# Altium footprint library B105connectors.PcbLib: 71 footprints (part 1 of 5)
Each footprint in its own frame and in the unit in brackets; x right, y up, seen from the top. Pads: shape width x height; smd on the part's side, far side on the other; paste and mask are expansions set on the pad; w line width, h text height; cw(c..) or ccw(c..) is an arc to the next point about the centre after c.
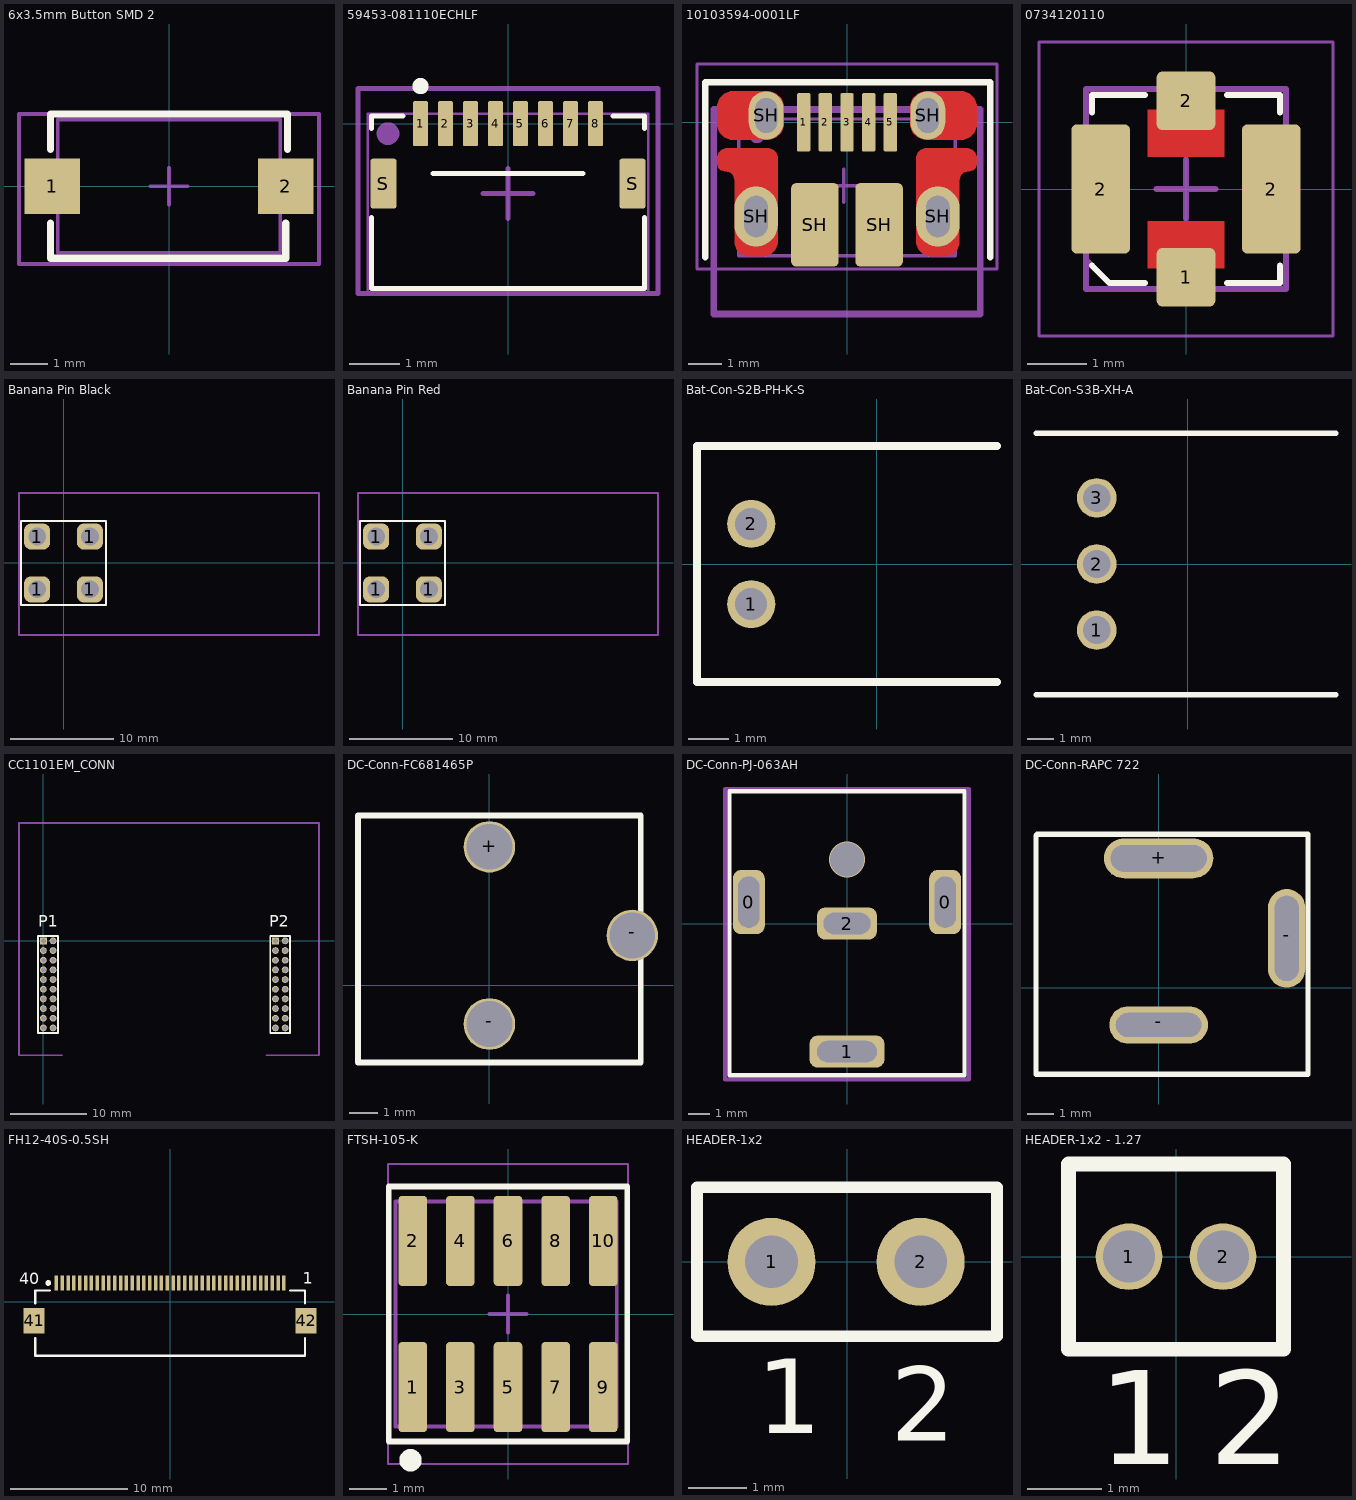
[diagram p0: the footprints below, top view; thin cyan lines are the x and y axes]

## 6x3.5mm Button SMD 2 [mm]
height 2.5
pads (2):
  rect 1.5x1.5 smd: 1(-3.15,0) 2(3.15,0)
Top Overlay:
  lines w0.2: -3.2,-1 -3.2,-1.95 3.15,-1.95 3.15,-1 ; -3.2,1 -3.2,1.95 3.2,1.95 3.2,1
Mechanical 13:
  lines w0.1: -3,-1.8 3,-1.8 3,1.8 -3,1.8 -3,-1.8
Mechanical 15:
  lines w0.1: -0.5,0 0.5,0 ; 0,-0.5 0,0.5 ; -4.05,-2.1 4.05,-2.1 4.05,1.95 -4.05,1.95 -4.05,-2.1
3D body "Button 6mm.step": height 2.5, standoff 0, extent -3.05,-1.85 3.05,1.85

## 59453-081110ECHLF [mm]
pads (10):
  rrect20% 0.3x0.9 smd: 1(-1.75,0) 2(-1.25,0) 3(-0.75,0) 4(-0.25,0) 5(0.25,0) 6(0.75,0) 7(1.25,0) 8(1.75,0)
  rrect20% 0.52x1 smd: S(-2.49,-1.2) S(2.49,-1.2)
Top Overlay:
  circle w0.254: c-1.75,0.75 r0.035
  lines w0.1: -2.725,-1.875 -2.725,-3.3 2.7,-3.3 2.725,-3.3 2.725,-1.875 ; -2.725,-0.1 -2.725,0.15 -2.1,0.15 ; -1.5,-1 1.5,-1 ; 2.1,0.15 2.725,0.15 2.725,-0.1
Mechanical 5:
  circle w0.254: c-2.4,-0.2 r0.1
  lines w0.05: -2.8,-3.4 -2.8,0.2 2.8,0.2 2.8,-3.4 -2.8,-3.4
  text ".Designator" at 1.95,-0.9 h1.5
Mechanical 15:
  lines w0.1: -0.5,-1.4 0.5,-1.4 ; 0,-1.9 0,-0.9 ; -3,-3.4 -3,0.7 3,0.7 3,-3.4 -3,-3.4
3D body "59453-081110echlf.stp": height 0.9, standoff 0, extent -2.75,-3.4 2.75,0.2

## 10103594-0001LF [mm]
pads (11):
  rrect20% 0.4x1.75 smd: 1(-1.3,0) 2(-0.65,0) 3(0,0) 4(0.65,0) 5(1.3,0)
  oval 1.3x1.8 hole 0.7 slot 1.25 at 90 deg: SH(-2.725,-2.825) SH(2.725,-2.825)
  oval 1.05x1.45 hole 0.65 slot 1.05 at 90 deg: SH(-2.425,0.205) SH(2.425,0.205)
  rrect20% 1.425x2.5 smd: SH(-0.962,-3.075) SH(0.962,-3.075)
Top Layer:
  region: -1.9,-0.025 -1.9,0.435 -1.9,0.534 -1.976,0.718 -2.117,0.859 -2.301,0.935 -2.4,0.935 -3.4,0.935 -3.499,0.935 -3.683,0.859 -3.824,0.718 -3.9,0.534 -3.9,0.435 -3.9,-0.025 -3.9,-0.124 -3.824,-0.308 -3.683,-0.449 -3.499,-0.525 -3.4,-0.525 -2.4,-0.525 -2.301,-0.525 -2.117,-0.449 -1.976,-0.308 -1.9,-0.124
  region: -2.075,-3.55 -2.075,-3.644 -2.147,-3.819 -2.281,-3.953 -2.456,-4.025 -2.55,-4.025 -2.9,-4.025 -2.994,-4.025 -3.169,-3.953 -3.303,-3.819 -3.375,-3.644 -3.375,-3.55 -3.375,-1.738 -3.38,-1.686 -3.419,-1.592 -3.492,-1.519 -3.586,-1.48 -3.638,-1.475 -3.69,-1.475 -3.786,-1.435 -3.86,-1.361 -3.9,-1.265 -3.9,-1.213 -3.9,-1.1 -3.9,-1.035 -3.851,-0.916 -3.759,-0.824 -3.64,-0.775 -3.575,-0.775 -2.4,-0.775 -2.335,-0.775 -2.216,-0.824 -2.124,-0.916 -2.075,-1.035 -2.075,-1.1
  region: 2.075,-3.55 2.075,-3.644 2.147,-3.819 2.281,-3.953 2.456,-4.025 2.55,-4.025 2.9,-4.025 2.994,-4.025 3.169,-3.953 3.303,-3.819 3.375,-3.644 3.375,-3.55 3.375,-1.738 3.38,-1.686 3.419,-1.592 3.492,-1.519 3.586,-1.48 3.638,-1.475 3.69,-1.475 3.786,-1.435 3.86,-1.361 3.9,-1.265 3.9,-1.213 3.9,-1.1 3.9,-1.035 3.851,-0.916 3.759,-0.824 3.64,-0.775 3.575,-0.775 2.4,-0.775 2.335,-0.775 2.216,-0.824 2.124,-0.916 2.075,-1.035 2.075,-1.1
  region: 1.9,-0.025 1.9,0.435 1.9,0.534 1.976,0.718 2.117,0.859 2.301,0.935 2.4,0.935 3.4,0.935 3.499,0.935 3.683,0.859 3.824,0.718 3.9,0.534 3.9,0.435 3.9,-0.025 3.9,-0.124 3.824,-0.308 3.683,-0.449 3.499,-0.525 3.4,-0.525 2.4,-0.525 2.301,-0.525 2.117,-0.449 1.976,-0.308 1.9,-0.124
Top Overlay:
  lines w0.2: -4.25,-4.05 -4.25,1.2 4.25,1.2 ; 4.3,-4.05 4.3,1.2
Top Paste:
  rectangle: -4,-4.25 -2,-0.8
  rectangle: -4,-0.5 -1.9,1.25
  region: 4,1.25 1.9,1.25 1.9,-0.5 4,-0.5
  region: 4,-0.8 2,-0.8 2,-4.25 4,-4.25
Mechanical 5:
  circle w0.254: c-2.7,-0.4 r0.1
  lines w0.1: -3.25,-4 -3.25,0.1 3.25,0.1 3.25,-4 -3.25,-4
  text ".Designator" at -1.4,-2.5 h1.5
Mechanical 13:
  lines w0.2: -4,-5.75 -4,0.384 4,0.384 4,-5.75 -4,-5.75
Mechanical 15:
  lines w0.1: -0.6,-1.9 0.4,-1.9 ; -0.1,-2.4 -0.1,-1.4 ; -4.5,-4.4 -4.5,1.75 4.5,1.75 4.5,-4.4 -4.5,-4.4
3D body "musb.step": height 2.88, standoff -0.72, extent -4.02,-5.649 4.02,0.384
3D body "USB Micro B plug.STEP": height 5.3, standoff -2.9, extent -5.25,-27.25 5.45,-2.75

## 0734120110 [mm]
pads (4):
  rrect20% 1x1 smd: 1(0,-1.5) 2(0,1.5)
  rrect20% 1x2.2 smd: 2(-1.45,0) 2(1.45,0)
Top Layer:
  pour cut-out: 0.65,-0.55 -0.65,-0.55 -0.65,-1.35 0.65,-1.35
  pour cut-out: -0.65,0.55 0.65,0.55 0.65,1.35 -0.65,1.35
Top Overlay:
  lines w0.1: -1.6,-1.3 -1.3,-1.6 -0.7,-1.6 ; -1.6,1.3 -1.6,1.6 -0.7,1.6 ; 0.7,-1.6 1.6,-1.6 1.6,-1.3 ; 0.7,1.6 1.6,1.6 1.6,1.3
Mechanical 5:
  lines w0.1: -1.7,-1.2 -1.2,-1.7 ; -1.7,-1.7 1.7,-1.7 1.7,1.7 -1.7,1.7 -1.7,-1.7
  text ".Designator" at -0.7,-0.4 h0.64
Mechanical 15:
  lines w0.05: -2.5,-2.5 -2.5,2.5 2.5,2.5 2.5,-2.5 -2.5,-2.5
  lines w0.1: -0.5,0 0.5,0 ; 0,-0.5 0,0.5
3D body "User Library-U_FL-R-SMT-1.step": height 1.25, standoff -0.01, extent -1.5,-1.55 1.5,1.55

## Banana Pin Black [mm] "CT3151SP-0"
pads (4):
  rrect50% 2.5x2.5 hole 1.7: 1(-2.55,-2.55) 1(-2.55,2.55) 1(2.55,-2.55) 1(2.55,2.55)
Top Overlay:
  lines w0.2: -4.1,-4.05 -4.1,4.05 4.1,4.05 4.1,-4.05 -4.1,-4.05
Mechanical 13:
  lines w0.2: -4.3,-6.95 -4.3,6.75 -3.35,6.75 24.65,6.75 24.65,-6.95 -4.3,-6.95
3D body "User Library-ct3151sp-0-BLK-300.step": height 14.35, standoff -3.05, extent -3.26,-6.831 24.54,6.631

## Banana Pin Red [mm] "CT3151SP-2"
pads (4):
  rrect50% 2.5x2.5 hole 1.7: 1(-2.55,-2.55) 1(-2.55,2.55) 1(2.55,-2.55) 1(2.55,2.55)
Top Overlay:
  lines w0.2: -4.1,-4.05 -4.1,4.05 4.1,4.05 4.1,-4.05 -4.1,-4.05
Mechanical 13:
  lines w0.2: -4.3,-6.95 -4.3,6.75 -3.35,6.75 24.65,6.75 24.65,-6.95 -4.3,-6.95
3D body "User Library-ct3151sp-2-RED-300.step": height 14.35, standoff -3.05, extent -3.31,-6.831 24.49,6.631

## Bat-Con-S2B-PH-K-S [mm] "2-pin, through-hole PH series JST connector, 2mm pitch."
height 4.8
pads (2):
  round 1.2 hole 0.8: 1(-3.125,-1) 2(-3.125,1)
Top Overlay:
  lines w0.2: 3,-2.945 -4.475,-2.945 -4.475,2.945 3,2.945
3D body "BattConnector_S2B-PH-K-S.step": height 4.8, standoff -3.4, extent -4.475,-2.95 3.125,2.95

## Bat-Con-S3B-XH-A [mm] "3-pin, through-hole XH series JST connector, 2.5mm pitch."
height 6.1
pads (3):
  round 1.5 hole 1.05: 1(-3.45,-2.5) 2(-3.45,0) 3(-3.45,2.5)
Top Overlay:
  lines w0.2: -5.75,-4.95 5.6,-4.95 ; -5.75,4.95 5.6,4.95
3D body "S3B-XH-A.STEP": height 6.25, standoff -3.3, extent -5.75,-4.95 5.75,4.95

## CC1101EM_CONN [mil]
pads (40):
  rect 35x35 hole 25: P1-1(0,0) P2-1(1200,0)
  round 35 hole 25: P1-2(50,0) P1-3(0,-50) P1-4(50,-50) P1-5(0,-100) P1-6(50,-100) P1-7(0,-150) P1-8(50,-150) P1-9(0,-200) P1-10(50,-200) P1-11(0,-250) P1-12(50,-250) P1-13(0,-300) P1-14(50,-300) P1-15(0,-350) P1-16(50,-350) P1-17(0,-400) P1-18(50,-400) P1-19(0,-450) P1-20(50,-450) P2-2(1250,0) P2-3(1200,-50) P2-4(1250,-50) P2-5(1200,-100) P2-6(1250,-100) P2-7(1200,-150) P2-8(1250,-150) P2-9(1200,-200) P2-10(1250,-200) P2-11(1200,-250) P2-12(1250,-250) P2-13(1200,-300) P2-14(1250,-300) P2-15(1200,-350) P2-16(1250,-350) P2-17(1200,-400) P2-18(1250,-400) P2-19(1200,-450) P2-20(1250,-450)
Top Overlay:
  lines w10: -27,-476 75,-476 75,25 -27,25 -27,-476 ; 1173,-476 1275,-476 1275,25 1173,25 1173,-476
  text "P2" at 1169,74 h60
  text "P1" at -27,74 h60
Mechanical 1:
  lines w7.87: -125.98,-590.55 98.43,-590.55 ; 1153.54,-590.55 1425.2,-590.55
  lines w10: -125,-590 -125,610 1425,610 1425,-590

## DC-Conn-FC681465P [mm]
pads (3):
  round 1.8 hole 1.6: +(0,4.85) -(0,-1.35) -(5,1.75)
Top Overlay:
  lines w0.2: -4.6,-2.7 -4.6,5.95 5.3,5.95 5.3,-2.7 -4.6,-2.7
3D body "DC-10A-FC6814.step": height 11, standoff -3.5, extent -4.5,-8.95 4.8,5.45

## DC-Conn-PJ-063AH [mm]
pads (4):
  rrect50% 1.5x3 hole 1 slot 2.4 at 90 deg: 0(-4.6,1) 0(4.6,1)
  rrect50% 3.5x1.5 hole 1 slot 2.8 at 0 deg: 1(0,-6)
  rrect50% 2.8x1.5 hole 1 slot 2.2 at 0 deg: 2(0,0)
via 0,3 diameter 1.7 hole 1.6
Top Overlay:
  lines w0.2: -5.5,-7.1 5.5,-7.1 5.5,6.2 -5.5,6.2 -5.5,-7.1
Mechanical 13:
  lines w0.2: -5.7,-7.3 5.7,-7.3 5.7,6.3 -5.7,6.3 -5.7,6.05 -5.7,-7.3
3D body "pj-063ah.stp": height 9, standoff -3, extent -5.15,-6.95 5.15,6.05

## DC-Conn-RAPC 722 [mm]
pads (3):
  oval 4.1x1.5 hole 1 slot 3.6 at 0 deg: +(0,4.85)
  oval 3.7x1.4 hole 0.9 slot 3.2 at 0 deg: -(0,-1.4)
  oval 1.4x3.7 hole 0.9 slot 3.2 at 90 deg: -(4.8,1.85)
Top Overlay:
  lines w0.2: -4.6,-3.25 -4.6,5.7 -4.55,5.75 5.6,5.75 5.6,-3.25 -4.6,-3.25
3D body "DC-conn-rapc722.step": height 10.92, standoff -3.56, extent -4.4,-9.102 5.125,5.502

## FH12-40S-0.5SH [mm] "Connector; FH12 Series; 40 Position; 0.5mm Spaced Bottom Contact"
height 2
pads (42):
  rect 0.3x1.3 smd: 1(9.75,1.625) 2(9.25,1.625) 3(8.75,1.625) 4(8.25,1.625) 5(7.75,1.625) 6(7.25,1.625) 7(6.75,1.625) 8(6.25,1.625) 9(5.75,1.625) 10(5.25,1.625) 11(4.75,1.625) 12(4.25,1.625) 13(3.75,1.625) 14(3.25,1.625) 15(2.75,1.625) 16(2.25,1.625) 17(1.75,1.625) 18(1.25,1.625) 19(0.75,1.625) 20(0.25,1.625) 21(-0.25,1.625) 22(-0.75,1.625) 23(-1.25,1.625) 24(-1.75,1.625) 25(-2.25,1.625) 26(-2.75,1.625) 27(-3.25,1.625) 28(-3.75,1.625) 29(-4.25,1.625) 30(-4.75,1.625) 31(-5.25,1.625) 32(-5.75,1.625) 33(-6.25,1.625) 34(-6.75,1.625) 35(-7.25,1.625) 36(-7.75,1.625) 37(-8.25,1.625) 38(-8.75,1.625) 39(-9.25,1.625) 40(-9.75,1.625)
  rect 1.8x2.2 smd: 41(-11.65,-1.625) 42(11.65,-1.625)
Top Overlay:
  circle w0.25: c-10.45,1.625 r0.125
  lines w0.2: -11.55,-3.125 -11.55,-4.625 11.55,-4.625 11.55,-3.125 ; -11.55,-0.125 -11.55,0.975 -10.3,0.975 ; 10.3,0.975 11.55,0.975 11.55,-0.125
  text "1" at 11.35,1.55 h1
  text "40" at -12.95,1.5 h1
3D body "31820.stp": height 1.2, standoff -0.02, extent -11,-1.65 11,1.35

## FTSH-105-K [mm]
pads (10):
  rrect25% 0.76x2.4 smd: 1(-2.54,-1.95) 2(-2.54,1.95) 3(-1.27,-1.95) 4(-1.27,1.95) 5(0,-1.95) 6(0,1.95) 7(1.27,-1.95) 8(1.27,1.95) 9(2.54,-1.95) 10(2.54,1.95)
Top Overlay:
  circle w0.4: c-2.6,-3.9 r0.1
  lines w0.15: -3.175,-3.4 -3.175,3.4 3.175,3.4 3.175,-3.4 -3.175,-3.4
Mechanical 5:
  lines w0.1: -3,-3 -3,3 2.9,3 2.9,-3 -3,-3
  text ".Designator" at 0.6,-1 h1.2
Mechanical 15:
  lines w0.05: -3.2,-4 3.2,-4 3.2,4 -3.2,4 -3.2,-4
  lines w0.1: -0.5,0 0.5,0 ; 0,-0.5 0,0.5
3D body "FTSH-105-01-F-DV-K.stp": height 5.71, standoff -0.41, extent -3.175,-2.921 3.175,2.921

## HEADER-1x2 [mm]
pads (2):
  round 1.5 hole 0.9: 1(-1.29,0) 2(1.25,0)
Top Overlay:
  lines w0.2: -2.56,-1.27 2.55,-1.27 2.55,1.27 -2.56,1.27 -2.56,-1.27
  text "2" at 0.742,-3.048 h1.27
  text "1" at -1.544,-2.921 h1.27
3D body "User Library-Header_Male_1Pin.STEP": height 8.54, standoff -3, extent -2.57,-1.245 -0.03,1.245
3D body "User Library-Header_Male_1Pin.STEP": height 8.54, standoff -3, extent -0.02,-1.245 2.52,1.245

## HEADER-1x2 - 1.27 [mm]
pads (2):
  round 0.9 hole 0.7: 1(-0.635,0) 2(0.635,0)
Top Overlay:
  lines w0.2: -1.45,-1.25 1.45,-1.25 1.45,1.25 -1.45,1.25 -1.45,-1.25
  text "1" at -1.05,-2.8 h1.27
  text "2" at 0.45,-2.8 h1.27